# Altium footprint library PCB_CONNECTORS.PcbLib: 676 footprints (part 24 of 43) (continued)
## PHOENIX_1751248 [mm] "Terminal Block, 10A 160V, Pitch 3.5mm, 2 Positions, Screw Connection"
height 8.5
pads (2):
  round 1.8 hole 1.1: 1(-1.75,0) 2(1.75,0)
Top Overlay:
  circle w0.2: c1.75,-0.05 r1.45
  circle w0.2: c-1.75,-0.05 r1.45
  lines w0.2: -3.75,-2.049 3.75,-2.049 ; -3.75,-1.566 3.75,-1.566 ; -3.75,1.487 3.75,1.487 ; -3.75,1.962 3.75,1.962 ; -3.75,-3.6 -3.75,3.7 3.75,3.7 3.75,-3.6 -3.75,-3.6
  text "2" at 1.45,2.375 h1
  text "1" at -1.95,2.375 h1
Mechanical 8:
  lines w0.1: -2.75,0 -1.75,0 ; -1.75,-1 -1.75,0 ; -1.75,1 -1.75,0 ; -1,0 0,0 ; -0.75,0 -1.75,0 ; 0,-1 0,0 ; 0,1 0,0 ; 0.75,0 1.75,0 ; 1,0 0,0 ; 1.75,-1 1.75,0 ; 1.75,1 1.75,0 ; 2.75,0 1.75,0
Mechanical 14:
  circle w0.1: c1.75,-0.05 r1.4
  circle w0.1: c-1.75,-0.05 r1.4
  circle w0.1: c1.75,-0.05 r1.45
  circle w0.1: c-1.75,-0.05 r1.45
  lines w0.1: -3.75,-2.049 3.75,-2.049 ; -3.75,-1.566 3.75,-1.566 ; -3.75,1.487 3.75,1.487 ; -3.75,1.962 3.75,1.962 ; -2.956,-0.761 -1.039,1.156 ; -2.461,-1.256 -0.544,0.661 ; 0.544,-0.761 2.461,1.156 ; 1.039,-1.256 2.956,0.661 ; -3.75,-3.6 -3.75,3.7 3.75,3.7 3.75,-3.6 -3.75,-3.6
3D body "PHOENIX_1751248.stp": height 8.5, standoff -3.5, extent -3.75,-3.6 3.75,3.7

## PHOENIX_1751248 - duplicate [mm] "Terminal Block, 10A 160V, Pitch 3.5mm, 2 Positions, Screw Connection"
height 8.5
pads (2):
  round 1.8 hole 1.1: 1(-1.75,0) 2(1.75,0)
Top Overlay:
  circle w0.2: c1.75,-0.05 r1.45
  circle w0.2: c-1.75,-0.05 r1.45
  lines w0.2: -3.75,-2.049 3.75,-2.049 ; -3.75,-1.566 3.75,-1.566 ; -3.75,1.487 3.75,1.487 ; -3.75,1.962 3.75,1.962 ; -3.75,-3.6 -3.75,3.7 3.75,3.7 3.75,-3.6 -3.75,-3.6
  text "2" at 1.45,2.375 h1
  text "1" at -1.95,2.375 h1
Mechanical 8:
  lines w0.1: -2.75,0 -1.75,0 ; -1.75,-1 -1.75,0 ; -1.75,1 -1.75,0 ; -1,0 0,0 ; -0.75,0 -1.75,0 ; 0,-1 0,0 ; 0,1 0,0 ; 0.75,0 1.75,0 ; 1,0 0,0 ; 1.75,-1 1.75,0 ; 1.75,1 1.75,0 ; 2.75,0 1.75,0
Mechanical 14:
  circle w0.1: c1.75,-0.05 r1.4
  circle w0.1: c-1.75,-0.05 r1.4
  circle w0.1: c1.75,-0.05 r1.45
  circle w0.1: c-1.75,-0.05 r1.45
  lines w0.1: -3.75,-2.049 3.75,-2.049 ; -3.75,-1.566 3.75,-1.566 ; -3.75,1.487 3.75,1.487 ; -3.75,1.962 3.75,1.962 ; -2.956,-0.761 -1.039,1.156 ; -2.461,-1.256 -0.544,0.661 ; 0.544,-0.761 2.461,1.156 ; 1.039,-1.256 2.956,0.661 ; -3.75,-3.6 -3.75,3.7 3.75,3.7 3.75,-3.6 -3.75,-3.6
3D body "PHOENIX_1751248.stp": height 8.5, standoff -3.5, extent -3.75,-3.6 3.75,3.7

## PHOENIX_1752214 [mm] "PHOENIX STPA Serie, Pitch 5mm, 9A, 320V, 2 Positions Terminal Block (Spring-Cage Connection)"
height 12.4
pads (2):
  round 1.8 hole 1.1: 1(-2.5,0) 2(2.5,0)
Top Overlay:
  lines w0.2: -4.85,-1.072 -3.236,-1.072 ; -4.85,-0.852 -3.482,-0.852 ; -4.25,-5.7 -4.25,-1.293 -1.2,-1.293 -1.2,-5.7 ; -4.15,-1.293 -4.15,-1.724 -1.3,-1.724 -1.3,-1.303 ; -4.086,-3.716 ccw(c-2.938,-3.134) -3.514,-4.285 ; -4.06,-3.663 ccw(c-2.927,-3.102) -3.525,-4.215 ; -3.877,-3.39 ccw(c-2.909,-2.943) -3.537,-3.804 -1.913,-3.804 ; -3.7,0.5 -4.75,0.5 ; -3.536,-3.804 ccw(c-0.578,-3.907) -3.514,-4.285 ; -3.412,-3.021 ccw(c-2.725,-4.361) -4.225,-4.223 ccw(c-2.725,-4.066) -1.225,-4.214 ccw(c-2.725,-4.361) -2.037,-3.021 ; -2.87,1.246 cw(c-2.2,1.043) -1.5,1.043 -1.5,0.831 ; -1.925,-4.215 ccw(c-2.523,-3.102) -1.39,-3.662 ; -1.764,-1.072 1.764,-1.072 ; -1.573,-3.39 cw(c-2.541,-2.943) -1.913,-3.804 ; -1.518,-0.852 1.518,-0.852 ; -1.363,-3.715 cw(c-2.512,-3.134) -1.936,-4.285 ; -1.3,0.5 1.3,0.5 ; -0.75,-5.7 -0.75,-1.293 3.8,-1.293 3.8,-5.7 ; 0.75,-5.7 0.75,-1.293 ; 0.85,-1.293 0.85,-1.724 3.7,-1.724 3.7,-1.303 ; 0.914,-3.716 ccw(c2.062,-3.134) 1.486,-4.285 ; 0.94,-3.663 ccw(c2.073,-3.102) 1.475,-4.215 ; 1.123,-3.39 ccw(c2.091,-2.943) 1.463,-3.804 3.087,-3.804 ; 1.464,-3.804 ccw(c4.422,-3.907) 1.486,-4.285 ; 1.588,-3.021 ccw(c2.276,-4.361) 0.775,-4.223 ccw(c2.275,-4.066) 3.775,-4.214 ccw(c2.276,-4.361) 2.963,-3.021 ; 2.13,1.246 cw(c2.8,1.043) 3.5,1.043 3.5,0.831 ; 3.236,-1.072 4.25,-1.072 ; 3.427,-3.39 cw(c2.459,-2.943) 3.087,-3.804 ; 3.482,-0.852 4.25,-0.852 ; 3.637,-3.715 cw(c2.488,-3.134) 3.064,-4.285 ; 3.7,0.5 4.25,0.5 ; -4.75,0.5 -4.85,0.5 -4.85,-5.7 4.25,-5.7 4.25,4.3 -4.75,4.3 -4.75,0.5 ; -3.514,-4.285 ccw(c-2.725,-3.509) -1.936,-4.285 ; -1.936,-4.285 ccw(c-5.102,-3.888) -1.913,-3.804 ; 1.486,-4.285 ccw(c2.275,-3.509) 3.064,-4.285 ; 3.064,-4.285 ccw(c-0.102,-3.888) 3.087,-3.804 ; -4.15,-3.021 -1.3,-3.021 -1.3,-2.091 -4.15,-2.091 -4.15,-3.021 ; 0.85,-3.021 3.7,-3.021 3.7,-2.091 0.85,-2.091 0.85,-3.021
Mechanical 8:
  lines w0.1: -3,0 -2.5,0 ; -2.5,-0.5 -2.5,0 ; -2.5,0.5 -2.5,0 ; -2,0 -2.5,0 ; -0.5,0 0,0 ; 0,-0.5 0,0 ; 0,0.5 0,0 ; 0.5,0 0,0 ; 2,0 2.5,0 ; 2.5,-0.5 2.5,0 ; 2.5,0.5 2.5,0 ; 3,0 2.5,0
Mechanical 14:
  lines w0.1: -4.85,-1.072 4.25,-1.072 ; -4.85,-0.852 4.25,-0.852 ; -4.25,-5.7 -4.25,-1.293 -1.2,-1.293 -1.2,-5.7 ; -4.15,-1.293 -4.15,-1.724 -1.3,-1.724 -1.3,-1.303 ; -4.086,-3.716 ccw(c-2.938,-3.134) -3.514,-4.285 ; -4.06,-3.663 ccw(c-2.927,-3.102) -3.525,-4.215 ; -3.877,-3.39 ccw(c-2.909,-2.943) -3.537,-3.804 -1.913,-3.804 ; -3.536,-3.804 ccw(c-0.578,-3.907) -3.514,-4.285 ; -3.412,-3.021 ccw(c-2.725,-4.361) -4.225,-4.223 ccw(c-2.725,-4.066) -1.225,-4.214 ccw(c-2.725,-4.361) -2.037,-3.021 ; -2.9,0.64 -1.5,0.64 ; -1.925,-4.215 ccw(c-2.523,-3.102) -1.39,-3.662 ; -1.573,-3.39 cw(c-2.541,-2.943) -1.913,-3.804 ; -1.363,-3.715 cw(c-2.512,-3.134) -1.936,-4.285 ; -0.75,-5.7 -0.75,-1.293 3.8,-1.293 3.8,-5.7 ; 0.75,-5.7 0.75,-1.293 ; 0.85,-1.293 0.85,-1.724 3.7,-1.724 3.7,-1.303 ; 0.914,-3.716 ccw(c2.062,-3.134) 1.486,-4.285 ; 0.94,-3.663 ccw(c2.073,-3.102) 1.475,-4.215 ; 1.123,-3.39 ccw(c2.091,-2.943) 1.463,-3.804 3.087,-3.804 ; 1.464,-3.804 ccw(c4.422,-3.907) 1.486,-4.285 ; 1.588,-3.021 ccw(c2.276,-4.361) 0.775,-4.223 ccw(c2.275,-4.066) 3.775,-4.214 ccw(c2.276,-4.361) 2.963,-3.021 ; 2.1,0.64 3.5,0.64 ; 3.427,-3.39 cw(c2.459,-2.943) 3.087,-3.804 ; 3.637,-3.715 cw(c2.488,-3.134) 3.064,-4.285 ; 4.25,0.5 3.5,0.5 3.5,1.043 ccw(c2.8,1.043) 2.1,1.043 2.1,0.5 -1.5,0.5 -1.5,1.043 ccw(c-2.2,1.043) -2.9,1.043 -2.9,0.5 -4.75,0.5 ; -4.75,0.5 -4.75,4.3 4.25,4.3 4.25,-5.7 -4.85,-5.7 -4.85,0.5 -4.75,0.5 ; -3.514,-4.285 ccw(c-2.725,-3.509) -1.936,-4.285 ; -1.936,-4.285 ccw(c-5.102,-3.888) -1.913,-3.804 ; 1.486,-4.285 ccw(c2.275,-3.509) 3.064,-4.285 ; 3.064,-4.285 ccw(c-0.102,-3.888) 3.087,-3.804 ; -4.15,-3.021 -1.3,-3.021 -1.3,-2.091 -4.15,-2.091 -4.15,-3.021 ; 0.85,-3.021 3.7,-3.021 3.7,-2.091 0.85,-2.091 0.85,-3.021
3D body "PHOENIX_1752214.stp": height 12.4, standoff -3.5, extent -4.85,-5.7 4.25,4.3

## PHOENIX_1755736 [mm] "PCB Header, 12A 250 V, Pitch: 2.54mm, 2 Positions, MSTBVA Serie"
height 12
pads (2):
  round 2.1 hole 1.4: 1(-2.54,0) 2(2.54,0)
Top Overlay:
  lines w0.2: -6.08,4.265 -3.515,4.265 ; -5.08,-2.165 -4.58,-2.165 ; -5.08,3.128 5.08,3.128 ; -3.145,3.128 -3.145,4.738 ; -1.935,3.128 -1.935,4.738 ; 1.935,3.128 1.935,4.738 ; 3.145,3.128 3.145,4.738 ; 5.08,-2.165 4.58,-2.165 ; 6.08,4.265 3.515,4.265 ; -4.694,-2.465 ccw(c-2.54,0.036) -0.386,-2.465 ; -4.694,-2.465 -4.58,-2.165 ; -4.694,-2.465 -5.08,-2.465 -5.08,3.44 -3.515,3.44 ; -4.58,-2.165 ccw(c-2.54,0.033) -0.5,-2.165 ; -3.515,3.44 -3.184,3.128 -1.896,3.128 -1.565,3.44 ; -3.515,3.44 -3.515,4.265 ; -3.515,4.265 -3.145,4.738 ; -3.145,4.738 -1.935,4.738 ; -1.935,4.738 -1.565,4.265 ; -1.565,3.44 -1.565,4.265 ; -1.565,3.44 1.565,3.44 ; -1.565,4.265 1.565,4.265 ; -0.5,-2.165 0.5,-2.165 ; -0.5,-2.165 -0.386,-2.465 ; -0.386,-2.465 0.386,-2.465 ; 0.386,-2.465 ccw(c2.54,0.036) 4.694,-2.465 ; 0.386,-2.465 0.5,-2.165 ; 0.5,-2.165 ccw(c2.54,0.033) 4.58,-2.165 ; 1.565,3.44 1.565,4.265 ; 1.565,3.44 1.896,3.128 3.184,3.128 3.515,3.44 ; 1.565,4.265 1.935,4.738 ; 1.935,4.738 3.145,4.738 ; 3.145,4.738 3.515,4.265 ; 3.515,3.44 3.515,4.265 ; 3.515,3.44 5.08,3.44 5.08,-2.465 4.694,-2.465 ; 4.58,-2.165 4.694,-2.465 ; -6.08,-3.835 -6.08,4.765 6.08,4.765 6.08,-3.835 -6.08,-3.835
  text "1" at -2.65,1.485 h1.2
  text "2" at 2.155,1.485 h1.2
Mechanical 8:
  lines w0.1: -3.04,0 -2.54,0 ; -2.54,-0.5 -2.54,0 ; -2.54,0.5 -2.54,0 ; -2.04,0 -2.54,0 ; -0.5,0 0,0 ; 0,-0.5 0,0 ; 0,0.5 0,0 ; 0.5,0 0,0 ; 2.04,0 2.54,0 ; 2.54,-0.5 2.54,0 ; 2.54,0.5 2.54,0 ; 3.04,0 2.54,0
Mechanical 14:
  circle w0.1: c2.54,-0.035 r1.4
  lines w0.1: -6.08,4.265 -3.515,4.265 ; -5.08,-2.165 -4.58,-2.165 ; -5.08,3.128 5.08,3.128 ; -3.145,3.128 -3.145,4.738 ; -1.935,3.128 -1.935,4.738 ; 1.935,3.128 1.935,4.738 ; 3.145,3.128 3.145,4.738 ; 5.08,-2.165 4.58,-2.165 ; 6.08,4.265 3.515,4.265 ; -4.694,-2.465 ccw(c-2.54,0.036) -0.386,-2.465 ; -4.694,-2.465 -4.58,-2.165 ; -4.694,-2.465 -5.08,-2.465 -5.08,3.44 -3.515,3.44 ; -4.58,-2.165 ccw(c-2.54,0.033) -0.5,-2.165 ; -3.515,3.44 -3.184,3.128 -1.896,3.128 -1.565,3.44 ; -3.515,3.44 -3.515,4.265 ; -3.515,4.265 -3.145,4.738 ; -3.145,4.738 -1.935,4.738 ; -3.04,-0.535 -2.772,-0.267 ; -3.04,-0.535 -3.04,0.465 ; -3.04,-0.535 -2.04,-0.535 ; -3.04,0.465 -2.772,0.197 ; -3.04,0.465 -2.04,0.465 ; -2.772,-0.267 -2.772,0.197 ; -2.772,-0.267 -2.308,-0.267 ; -2.772,0.197 -2.308,0.197 ; -2.308,-0.267 -2.308,0.197 ; -2.308,-0.267 -2.04,-0.535 ; -2.308,0.197 -2.04,0.465 ; -2.04,-0.535 -2.04,0.465 ; -1.935,4.738 -1.565,4.265 ; -1.565,3.44 -1.565,4.265 ; -1.565,3.44 1.565,3.44 ; -1.565,4.265 1.565,4.265 ; -0.5,-2.165 0.5,-2.165 ; -0.5,-2.165 -0.386,-2.465 ; -0.386,-2.465 0.386,-2.465 ; 0.386,-2.465 ccw(c2.54,0.036) 4.694,-2.465 ; 0.386,-2.465 0.5,-2.165 ; 0.5,-2.165 ccw(c2.54,0.033) 4.58,-2.165 ; 1.565,3.44 1.565,4.265 ; 1.565,3.44 1.896,3.128 3.184,3.128 3.515,3.44 ; 1.565,4.265 1.935,4.738 ; 1.935,4.738 3.145,4.738 ; 2.04,-0.535 2.308,-0.267 ; 2.04,-0.535 2.04,0.465 ; 2.04,-0.535 3.04,-0.535 ; 2.04,0.465 2.308,0.197 ; 2.04,0.465 3.04,0.465 ; 2.308,-0.267 2.308,0.197 ; 2.308,-0.267 2.772,-0.267 ; 2.308,0.197 2.772,0.197 ; 2.772,-0.267 2.772,0.197 ; 2.772,-0.267 3.04,-0.535 ; 2.772,0.197 3.04,0.465 ; 3.04,-0.535 3.04,0.465 ; 3.145,4.738 3.515,4.265 ; 3.515,3.44 3.515,4.265 ; 3.515,3.44 5.08,3.44 5.08,-2.465 4.694,-2.465 ; 4.58,-2.165 4.694,-2.465 ; -6.08,-3.835 -6.08,4.765 6.08,4.765 6.08,-3.835 -6.08,-3.835 ; -3.24,-1.247 ccw(c-2.54,-0.035) -3.24,1.177 -3.24,-1.247
  text "1" at -2.65,1.485 h1.2
  text "2" at 2.155,1.485 h1.2
3D body "PHOENIX_1755736.stp": height 12, standoff -3.9, extent -6.08,-3.835 6.08,4.765

## PHOENIX_1755736 - duplicate [mm] "PCB Header, 12A 250 V, Pitch: 2.54mm, 2 Positions, MSTBVA Serie"
height 12
pads (2):
  round 2.1 hole 1.4: 1(-2.54,0) 2(2.54,0)
Top Overlay:
  lines w0.2: -6.08,4.265 -3.515,4.265 ; -5.08,-2.165 -4.58,-2.165 ; -5.08,3.128 5.08,3.128 ; -3.145,3.128 -3.145,4.738 ; -1.935,3.128 -1.935,4.738 ; 1.935,3.128 1.935,4.738 ; 3.145,3.128 3.145,4.738 ; 5.08,-2.165 4.58,-2.165 ; 6.08,4.265 3.515,4.265 ; -4.694,-2.465 ccw(c-2.54,0.036) -0.386,-2.465 ; -4.694,-2.465 -5.08,-2.465 -5.08,3.44 -3.515,3.44 ; -4.694,-2.465 -4.58,-2.165 ; -4.58,-2.165 ccw(c-2.54,0.033) -0.5,-2.165 ; -3.515,3.44 -3.515,4.265 ; -3.515,3.44 -3.184,3.128 -1.896,3.128 -1.565,3.44 ; -3.515,4.265 -3.145,4.738 ; -3.145,4.738 -1.935,4.738 ; -1.935,4.738 -1.565,4.265 ; -1.565,3.44 1.565,3.44 ; -1.565,3.44 -1.565,4.265 ; -1.565,4.265 1.565,4.265 ; -0.5,-2.165 -0.386,-2.465 ; -0.5,-2.165 0.5,-2.165 ; -0.386,-2.465 0.386,-2.465 ; 0.386,-2.465 ccw(c2.54,0.036) 4.694,-2.465 ; 0.386,-2.465 0.5,-2.165 ; 0.5,-2.165 ccw(c2.54,0.033) 4.58,-2.165 ; 1.565,3.44 1.896,3.128 3.184,3.128 3.515,3.44 ; 1.565,3.44 1.565,4.265 ; 1.565,4.265 1.935,4.738 ; 1.935,4.738 3.145,4.738 ; 3.145,4.738 3.515,4.265 ; 3.515,3.44 5.08,3.44 5.08,-2.465 4.694,-2.465 ; 3.515,3.44 3.515,4.265 ; 4.58,-2.165 4.694,-2.465 ; -6.08,-3.835 6.08,-3.835 6.08,4.765 -6.08,4.765 -6.08,-3.835
  text "2" at 2.2,3.5 h1
  text "1" at -2.7,3.425 h1
Mechanical 8:
  lines w0.1: -3.04,0 -2.54,0 ; -2.54,-0.5 -2.54,0 ; -2.54,0.5 -2.54,0 ; -2.04,0 -2.54,0 ; -0.5,0 0,0 ; 0,-0.5 0,0 ; 0,0.5 0,0 ; 0.5,0 0,0 ; 2.04,0 2.54,0 ; 2.54,-0.5 2.54,0 ; 2.54,0.5 2.54,0 ; 3.04,0 2.54,0
Mechanical 14:
  circle w0.1: c2.54,-0.035 r1.4
  lines w0.1: -6.08,4.265 -3.515,4.265 ; -5.08,-2.165 -4.58,-2.165 ; -5.08,3.128 5.08,3.128 ; -3.145,3.128 -3.145,4.738 ; -1.935,3.128 -1.935,4.738 ; 1.935,3.128 1.935,4.738 ; 3.145,3.128 3.145,4.738 ; 5.08,-2.165 4.58,-2.165 ; 6.08,4.265 3.515,4.265 ; -4.694,-2.465 ccw(c-2.54,0.036) -0.386,-2.465 ; -4.694,-2.465 -5.08,-2.465 -5.08,3.44 -3.515,3.44 ; -4.694,-2.465 -4.58,-2.165 ; -4.58,-2.165 ccw(c-2.54,0.033) -0.5,-2.165 ; -3.515,3.44 -3.515,4.265 ; -3.515,3.44 -3.184,3.128 -1.896,3.128 -1.565,3.44 ; -3.515,4.265 -3.145,4.738 ; -3.145,4.738 -1.935,4.738 ; -3.04,-0.535 -2.04,-0.535 ; -3.04,-0.535 -3.04,0.465 ; -3.04,-0.535 -2.772,-0.267 ; -3.04,0.465 -2.04,0.465 ; -3.04,0.465 -2.772,0.197 ; -2.772,-0.267 -2.308,-0.267 ; -2.772,-0.267 -2.772,0.197 ; -2.772,0.197 -2.308,0.197 ; -2.308,-0.267 -2.04,-0.535 ; -2.308,-0.267 -2.308,0.197 ; -2.308,0.197 -2.04,0.465 ; -2.04,-0.535 -2.04,0.465 ; -1.935,4.738 -1.565,4.265 ; -1.565,3.44 1.565,3.44 ; -1.565,3.44 -1.565,4.265 ; -1.565,4.265 1.565,4.265 ; -0.5,-2.165 -0.386,-2.465 ; -0.5,-2.165 0.5,-2.165 ; -0.386,-2.465 0.386,-2.465 ; 0.386,-2.465 ccw(c2.54,0.036) 4.694,-2.465 ; 0.386,-2.465 0.5,-2.165 ; 0.5,-2.165 ccw(c2.54,0.033) 4.58,-2.165 ; 1.565,3.44 1.896,3.128 3.184,3.128 3.515,3.44 ; 1.565,3.44 1.565,4.265 ; 1.565,4.265 1.935,4.738 ; 1.935,4.738 3.145,4.738 ; 2.04,-0.535 3.04,-0.535 ; 2.04,-0.535 2.04,0.465 ; 2.04,-0.535 2.308,-0.267 ; 2.04,0.465 3.04,0.465 ; 2.04,0.465 2.308,0.197 ; 2.308,-0.267 2.772,-0.267 ; 2.308,-0.267 2.308,0.197 ; 2.308,0.197 2.772,0.197 ; 2.772,-0.267 3.04,-0.535 ; 2.772,-0.267 2.772,0.197 ; 2.772,0.197 3.04,0.465 ; 3.04,-0.535 3.04,0.465 ; 3.145,4.738 3.515,4.265 ; 3.515,3.44 5.08,3.44 5.08,-2.465 4.694,-2.465 ; 3.515,3.44 3.515,4.265 ; 4.58,-2.165 4.694,-2.465 ; -6.08,-3.835 6.08,-3.835 6.08,4.765 -6.08,4.765 -6.08,-3.835 ; -3.24,-1.247 ccw(c-2.54,-0.035) -3.24,1.177 -3.24,-1.247
  text "1" at -2.7,3.425 h1
  text "2" at 2.2,3.5 h1
3D body "PHOENIX_1755736.stp": height 12, standoff -3.9, extent -6.08,-3.835 6.08,4.765

## PHOENIX_1755749 [mm] "PCB Header, 12A 250 V, Pitch: 2.54mm, 3 Positions, MSTBVA Serie"
height 12
pads (3):
  round 2.1 hole 1.4: 1(-5.08,0) 2(0,0) 3(5.08,0)
Top Overlay:
  lines w0.2: -8.62,4.3 -6.055,4.3 ; -7.62,-2.13 -7.12,-2.13 ; -7.234,-2.43 ccw(c-5.08,0.071) -2.926,-2.43 -3.04,-2.13 ; -5.685,3.163 -5.685,4.773 ; -4.475,3.163 -4.475,4.773 ; -2.926,-2.43 -2.154,-2.43 -2.04,-2.13 ; -2.154,-2.43 ccw(c0,0.071) 2.154,-2.43 2.04,-2.13 ; -0.605,3.163 -0.605,4.773 ; 0.605,3.163 0.605,4.773 ; 2.154,-2.43 2.926,-2.43 3.04,-2.13 ; 2.926,-2.43 ccw(c5.08,0.071) 7.234,-2.43 ; 4.475,3.163 4.475,4.773 ; 5.685,3.163 5.685,4.773 ; 7.62,-2.13 7.12,-2.13 ; 8.62,4.3 6.055,4.3 ; -7.234,-2.43 -7.62,-2.43 -7.62,3.475 -6.055,3.475 ; -7.234,-2.43 -7.12,-2.13 ; -7.234,-2.43 -7.12,-2.13 ; -7.12,-2.13 ccw(c-5.08,0.068) -3.04,-2.13 ; -6.055,3.475 -5.724,3.163 -4.436,3.163 -4.105,3.475 ; -6.055,3.475 -6.055,4.3 ; -6.055,4.3 -5.685,4.773 ; -5.685,4.773 -4.475,4.773 ; -4.475,4.773 -4.105,4.3 ; -4.105,3.475 -4.105,4.3 ; -4.105,3.475 -0.975,3.475 ; -4.105,4.3 -0.975,4.3 ; -3.04,-2.13 -2.04,-2.13 ; -2.04,-2.13 ccw(c0,0.068) 2.04,-2.13 ; -0.975,3.475 -0.644,3.163 0.644,3.163 0.975,3.475 ; -0.975,3.475 -0.975,4.3 ; -0.975,4.3 -0.605,4.773 ; -0.605,4.773 0.605,4.773 ; 0.605,4.773 0.975,4.3 ; 0.975,3.475 0.975,4.3 ; 0.975,3.475 4.105,3.475 ; 0.975,4.3 4.105,4.3 ; 2.04,-2.13 3.04,-2.13 ; 3.04,-2.13 ccw(c5.08,0.068) 7.12,-2.13 ; 4.105,3.475 4.436,3.163 5.724,3.163 6.055,3.475 ; 4.105,3.475 4.105,4.3 ; 4.105,4.3 4.475,4.773 ; 4.475,4.773 5.685,4.773 ; 5.685,4.773 6.055,4.3 ; 6.055,3.475 6.055,4.3 ; 6.055,3.475 7.62,3.475 7.62,-2.43 7.234,-2.43 ; 7.12,-2.13 7.234,-2.43 ; 7.12,-2.13 7.234,-2.43 ; -8.62,-3.8 8.62,-3.8 8.62,4.8 -8.62,4.8 -8.62,-3.8
  text "1" at -5.19,1.485 h1.2
  text "3" at 4.695,1.485 h1.2
Mechanical 8:
  lines w0.1: -5.58,0 -5.08,0 ; -5.08,-0.5 -5.08,0 ; -5.08,0.5 -5.08,0 ; -4.58,0 -5.08,0 ; 4.58,0 5.08,0 ; 5.08,-0.5 5.08,0 ; 5.08,0.5 5.08,0 ; 5.58,0 5.08,0 ; 0,0 0,0.5 0,0 ; 0,0 0.5,0 0,0 ; 0,0 0,-0.5 0,0 ; 0,0 -0.5,0 0,0
Mechanical 14:
  circle w0.1: c-5.08,0 r1.4
  circle w0.1: c0,0 r1.4
  circle w0.1: c5.08,0 r1.4
  lines w0.1: -8.62,4.3 -6.055,4.3 ; -7.62,-2.13 -7.12,-2.13 ; -7.234,-2.43 ccw(c-5.08,0.071) -2.926,-2.43 -3.04,-2.13 ; -5.685,3.163 -5.685,4.773 ; -4.475,3.163 -4.475,4.773 ; -2.926,-2.43 -2.154,-2.43 -2.04,-2.13 ; -2.154,-2.43 ccw(c0,0.071) 2.154,-2.43 2.04,-2.13 ; -0.605,3.163 -0.605,4.773 ; 0.605,3.163 0.605,4.773 ; 2.154,-2.43 2.926,-2.43 3.04,-2.13 ; 2.926,-2.43 ccw(c5.08,0.071) 7.234,-2.43 ; 4.475,3.163 4.475,4.773 ; 5.685,3.163 5.685,4.773 ; 7.62,-2.13 7.12,-2.13 ; 8.62,4.3 6.055,4.3 ; -7.234,-2.43 -7.62,-2.43 -7.62,3.475 -6.055,3.475 ; -7.234,-2.43 -7.12,-2.13 ; -7.234,-2.43 -7.12,-2.13 ; -7.12,-2.13 ccw(c-5.08,0.068) -3.04,-2.13 ; -6.055,3.475 -5.724,3.163 -4.436,3.163 -4.105,3.475 ; -6.055,3.475 -6.055,4.3 ; -6.055,4.3 -5.685,4.773 ; -5.685,4.773 -4.475,4.773 ; -5.58,-0.5 -4.58,-0.5 ; -5.58,-0.5 -5.58,0.5 ; -5.58,-0.5 -5.312,-0.232 ; -5.58,0.5 -4.58,0.5 ; -5.58,0.5 -5.312,0.232 ; -5.312,-0.232 -4.848,-0.232 ; -5.312,-0.232 -5.312,0.232 ; -5.312,0.232 -4.848,0.232 ; -4.848,-0.232 -4.58,-0.5 ; -4.848,-0.232 -4.848,0.232 ; -4.848,0.232 -4.58,0.5 ; -4.58,-0.5 -4.58,0.5 ; -4.475,4.773 -4.105,4.3 ; -4.105,3.475 -4.105,4.3 ; -4.105,3.475 -0.975,3.475 ; -4.105,4.3 -0.975,4.3 ; -3.04,-2.13 -2.04,-2.13 ; -2.04,-2.13 ccw(c0,0.068) 2.04,-2.13 ; -0.975,3.475 -0.644,3.163 0.644,3.163 0.975,3.475 ; -0.975,3.475 -0.975,4.3 ; -0.975,4.3 -0.605,4.773 ; -0.605,4.773 0.605,4.773 ; -0.5,-0.5 0.5,-0.5 ; -0.5,-0.5 -0.5,0.5 ; -0.5,-0.5 -0.232,-0.232 ; -0.5,0.5 0.5,0.5 ; -0.5,0.5 -0.232,0.232 ; -0.232,-0.232 0.232,-0.232 ; -0.232,-0.232 -0.232,0.232 ; -0.232,0.232 0.232,0.232 ; 0.232,-0.232 0.5,-0.5 ; 0.232,-0.232 0.232,0.232 ; 0.232,0.232 0.5,0.5 ; 0.5,-0.5 0.5,0.5 ; 0.605,4.773 0.975,4.3 ; 0.975,3.475 0.975,4.3 ; 0.975,3.475 4.105,3.475 ; 0.975,4.3 4.105,4.3 ; 2.04,-2.13 3.04,-2.13 ; 3.04,-2.13 ccw(c5.08,0.068) 7.12,-2.13 ; 4.105,3.475 4.436,3.163 5.724,3.163 6.055,3.475 ; 4.105,3.475 4.105,4.3 ; 4.105,4.3 4.475,4.773 ; 4.475,4.773 5.685,4.773 ; 4.58,-0.5 5.58,-0.5 ; 4.58,-0.5 4.58,0.5 ; 4.58,-0.5 4.848,-0.232 ; 4.58,0.5 5.58,0.5 ; 4.58,0.5 4.848,0.232 ; 4.848,-0.232 5.312,-0.232 ; 4.848,-0.232 4.848,0.232 ; 4.848,0.232 5.312,0.232 ; 5.312,-0.232 5.58,-0.5 ; 5.312,-0.232 5.312,0.232 ; 5.312,0.232 5.58,0.5 ; 5.58,-0.5 5.58,0.5 ; 5.685,4.773 6.055,4.3 ; 6.055,3.475 6.055,4.3 ; 6.055,3.475 7.62,3.475 7.62,-2.43 7.234,-2.43 ; 7.12,-2.13 7.234,-2.43 ; 7.12,-2.13 7.234,-2.43 ; -8.62,-3.8 8.62,-3.8 8.62,4.8 -8.62,4.8 -8.62,-3.8
  text "1" at -5.19,1.485 h1.2
  text "3" at 4.695,1.485 h1.2
3D body "PHOENIX_1755749.stp": height 12, standoff -3.9, extent -8.62,-3.8 8.62,4.8

## PHOENIX_1755752 [mm] "PCB Header, 12A 250 V, Pitch: 2.54mm, 4 Positions, MSTBVA Serie"
height 12
pads (4):
  round 2.1 hole 1.4: 1(-7.62,0) 2(-2.54,0) 3(2.54,0) 4(7.62,0)
Top Overlay:
  lines w0.2: -11.16,4.265 -8.595,4.265 ; -10.16,-2.165 -9.66,-2.165 ; -8.225,3.128 -8.225,4.738 ; -7.015,3.128 -7.015,4.738 ; -3.145,3.128 -3.145,4.738 ; -1.935,3.128 -1.935,4.738 ; 1.935,3.128 1.935,4.738 ; 3.145,3.128 3.145,4.738 ; 7.015,3.128 7.015,4.738 ; 8.225,3.128 8.225,4.738 ; 10.16,-2.165 9.66,-2.165 ; 10.16,3.44 10.16,-2.465 9.774,-2.465 ; 11.16,3.44 8.595,3.44 ; 11.16,4.265 8.595,4.265 ; -9.774,-2.465 ccw(c-7.62,0.036) -5.466,-2.465 ; -9.774,-2.465 -10.16,-2.465 -10.16,3.44 -8.595,3.44 ; -9.774,-2.465 -9.66,-2.165 ; -9.66,-2.165 ccw(c-7.62,0.033) -5.58,-2.165 ; -8.595,3.44 -8.595,4.265 ; -8.595,3.44 -8.264,3.128 -6.976,3.128 -6.645,3.44 ; -8.595,4.265 -8.225,4.738 ; -8.225,4.738 -7.015,4.738 ; -7.015,4.738 -6.645,4.265 ; -6.645,3.44 -3.515,3.44 ; -6.645,3.44 -6.645,4.265 ; -6.645,4.265 -3.515,4.265 ; -5.58,-2.165 -5.466,-2.465 ; -5.58,-2.165 -4.58,-2.165 ; -5.466,-2.465 -4.694,-2.465 ; -4.694,-2.465 ccw(c-2.54,0.036) -0.386,-2.465 ; -4.694,-2.465 -4.58,-2.165 ; -4.58,-2.165 ccw(c-2.54,0.033) -0.5,-2.165 ; -3.515,3.44 -3.184,3.128 -1.896,3.128 -1.565,3.44 ; -3.515,3.44 -3.515,4.265 ; -3.515,4.265 -3.145,4.738 ; -3.145,4.738 -1.935,4.738 ; -1.935,4.738 -1.565,4.265 ; -1.565,3.44 -1.565,4.265 ; -1.565,3.44 1.565,3.44 ; -1.565,4.265 1.565,4.265 ; -0.5,-2.165 -0.386,-2.465 ; -0.5,-2.165 0.5,-2.165 ; -0.386,-2.465 0.386,-2.465 ; 0.386,-2.465 ccw(c2.54,0.036) 4.694,-2.465 ; 0.386,-2.465 0.5,-2.165 ; 0.5,-2.165 ccw(c2.54,0.033) 4.58,-2.165 ; 1.565,3.44 1.896,3.128 3.184,3.128 3.515,3.44 ; 1.565,3.44 1.565,4.265 ; 1.565,4.265 1.935,4.738 ; 1.935,4.738 3.145,4.738 ; 3.145,4.738 3.515,4.265 ; 3.515,3.44 3.515,4.265 ; 3.515,3.44 6.645,3.44 ; 3.515,4.265 6.645,4.265 ; 4.58,-2.165 4.694,-2.465 ; 4.58,-2.165 5.58,-2.165 ; 4.694,-2.465 5.466,-2.465 ; 5.466,-2.465 ccw(c7.62,0.036) 9.774,-2.465 ; 5.466,-2.465 5.58,-2.165 ; 5.58,-2.165 ccw(c7.62,0.033) 9.66,-2.165 ; 6.645,3.44 6.976,3.128 8.264,3.128 8.595,3.44 ; 6.645,3.44 6.645,4.265 ; 6.645,4.265 7.015,4.738 ; 7.015,4.738 8.225,4.738 ; 8.225,4.738 8.595,4.265 ; 8.595,3.44 8.595,4.265 ; 9.66,-2.165 9.774,-2.465 ; -11.16,-3.835 11.16,-3.835 11.16,4.765 -11.16,4.765 -11.16,-3.835
  text "1" at -7.78,3.425 h1
  text "2" at -2.875,3.425 h1
  text "3" at 2.205,3.425 h1
  text "4" at 7.285,3.425 h1
Mechanical 8:
  lines w0.1: -3.04,0 -2.54,0 ; -2.54,-0.5 -2.54,0 ; -2.54,0.5 -2.54,0 ; -2.04,0 -2.54,0 ; -0.5,0 0,0 ; 0,-0.5 0,0 ; 0,0.5 0,0 ; 0.5,0 0,0 ; 2.04,0 2.54,0 ; 2.54,-0.5 2.54,0 ; 2.54,0.5 2.54,0 ; 3.04,0 2.54,0 ; 7.12,0 7.62,0 ; 7.62,-0.5 7.62,0 ; 7.62,0.5 7.62,0 ; 8.12,0 7.62,0 ; -7.62,0 -8.12,0 -7.62,0 ; -7.62,0 -7.62,0.5 -7.62,0 ; -7.62,0 -7.12,0 -7.62,0 ; -7.62,0 -7.62,-0.5 -7.62,0
Mechanical 14:
  circle w0.1: c-2.54,-0.035 r1.4
  circle w0.1: c2.54,-0.035 r1.4
  circle w0.1: c7.62,-0.035 r1.4
  lines w0.1: -11.16,4.265 -8.595,4.265 ; -10.16,-2.165 -9.66,-2.165 ; -8.225,3.128 -8.225,4.738 ; -7.015,3.128 -7.015,4.738 ; -3.145,3.128 -3.145,4.738 ; -1.935,3.128 -1.935,4.738 ; 1.935,3.128 1.935,4.738 ; 3.145,3.128 3.145,4.738 ; 7.015,3.128 7.015,4.738 ; 8.225,3.128 8.225,4.738 ; 10.16,-2.165 9.66,-2.165 ; 10.16,3.44 10.16,-2.465 9.774,-2.465 ; 11.16,3.44 8.595,3.44 ; 11.16,4.265 8.595,4.265 ; -9.774,-2.465 ccw(c-7.62,0.036) -5.466,-2.465 ; -9.774,-2.465 -10.16,-2.465 -10.16,3.44 -8.595,3.44 ; -9.774,-2.465 -9.66,-2.165 ; -9.66,-2.165 ccw(c-7.62,0.033) -5.58,-2.165 ; -8.595,3.44 -8.595,4.265 ; -8.595,3.44 -8.264,3.128 -6.976,3.128 -6.645,3.44 ; -8.595,4.265 -8.225,4.738 ; -8.225,4.738 -7.015,4.738 ; -8.12,-0.535 -7.12,-0.535 ; -8.12,-0.535 -8.12,0.465 ; -8.12,-0.535 -7.852,-0.267 ; -8.12,0.465 -7.12,0.465 ; -8.12,0.465 -7.852,0.197 ; -7.852,-0.267 -7.388,-0.267 ; -7.852,-0.267 -7.852,0.197 ; -7.852,0.197 -7.388,0.197 ; -7.388,-0.267 -7.12,-0.535 ; -7.388,-0.267 -7.388,0.197 ; -7.388,0.197 -7.12,0.465 ; -7.12,-0.535 -7.12,0.465 ; -7.015,4.738 -6.645,4.265 ; -6.645,3.44 -3.515,3.44 ; -6.645,3.44 -6.645,4.265 ; -6.645,4.265 -3.515,4.265 ; -5.58,-2.165 -5.466,-2.465 ; -5.58,-2.165 -4.58,-2.165 ; -5.466,-2.465 -4.694,-2.465 ; -4.694,-2.465 ccw(c-2.54,0.036) -0.386,-2.465 ; -4.694,-2.465 -4.58,-2.165 ; -4.58,-2.165 ccw(c-2.54,0.033) -0.5,-2.165 ; -3.515,3.44 -3.184,3.128 -1.896,3.128 -1.565,3.44 ; -3.515,3.44 -3.515,4.265 ; -3.515,4.265 -3.145,4.738 ; -3.145,4.738 -1.935,4.738 ; -3.04,-0.535 -2.04,-0.535 ; -3.04,-0.535 -3.04,0.465 ; -3.04,-0.535 -2.772,-0.267 ; -3.04,0.465 -2.04,0.465 ; -3.04,0.465 -2.772,0.197 ; -2.772,-0.267 -2.308,-0.267 ; -2.772,-0.267 -2.772,0.197 ; -2.772,0.197 -2.308,0.197 ; -2.308,-0.267 -2.04,-0.535 ; -2.308,-0.267 -2.308,0.197 ; -2.308,0.197 -2.04,0.465 ; -2.04,-0.535 -2.04,0.465 ; -1.935,4.738 -1.565,4.265 ; -1.565,3.44 -1.565,4.265 ; -1.565,3.44 1.565,3.44 ; -1.565,4.265 1.565,4.265 ; -0.5,-2.165 -0.386,-2.465 ; -0.5,-2.165 0.5,-2.165 ; -0.386,-2.465 0.386,-2.465 ; 0.386,-2.465 ccw(c2.54,0.036) 4.694,-2.465 ; 0.386,-2.465 0.5,-2.165 ; 0.5,-2.165 ccw(c2.54,0.033) 4.58,-2.165 ; 1.565,3.44 1.896,3.128 3.184,3.128 3.515,3.44 ; 1.565,3.44 1.565,4.265 ; 1.565,4.265 1.935,4.738 ; 1.935,4.738 3.145,4.738 ; 2.04,-0.535 3.04,-0.535 ; 2.04,-0.535 2.04,0.465 ; 2.04,-0.535 2.308,-0.267 ; 2.04,0.465 3.04,0.465 ; 2.04,0.465 2.308,0.197 ; 2.308,-0.267 2.772,-0.267 ; 2.308,-0.267 2.308,0.197 ; 2.308,0.197 2.772,0.197 ; 2.772,-0.267 3.04,-0.535 ; 2.772,-0.267 2.772,0.197 ; 2.772,0.197 3.04,0.465 ; 3.04,-0.535 3.04,0.465 ; 3.145,4.738 3.515,4.265 ; 3.515,3.44 3.515,4.265 ; 3.515,3.44 6.645,3.44 ; 3.515,4.265 6.645,4.265 ; 4.58,-2.165 4.694,-2.465 ; 4.58,-2.165 5.58,-2.165 ; 4.694,-2.465 5.466,-2.465 ; 5.466,-2.465 ccw(c7.62,0.036) 9.774,-2.465 ; 5.466,-2.465 5.58,-2.165 ; 5.58,-2.165 ccw(c7.62,0.033) 9.66,-2.165 ; 6.645,3.44 6.976,3.128 8.264,3.128 8.595,3.44 ; 6.645,3.44 6.645,4.265 ; 6.645,4.265 7.015,4.738 ; 7.015,4.738 8.225,4.738 ; 7.12,-0.535 8.12,-0.535 ; 7.12,-0.535 7.12,0.465 ; 7.12,-0.535 7.388,-0.267 ; 7.12,0.465 8.12,0.465 ; 7.12,0.465 7.388,0.197 ; 7.388,-0.267 7.852,-0.267 ; 7.388,-0.267 7.388,0.197 ; 7.388,0.197 7.852,0.197 ; 7.852,-0.267 8.12,-0.535 ; 7.852,-0.267 7.852,0.197 ; 7.852,0.197 8.12,0.465 ; 8.12,-0.535 8.12,0.465 ; 8.225,4.738 8.595,4.265 ; 8.595,3.44 8.595,4.265 ; 9.66,-2.165 9.774,-2.465 ; -11.16,-3.835 11.16,-3.835 11.16,4.765 -11.16,4.765 -11.16,-3.835 ; -8.32,-1.247 ccw(c-7.62,-0.035) -8.32,1.177 -8.32,-1.247
  text "1" at -7.78,3.425 h1
  text "2" at -2.875,3.425 h1
  text "3" at 2.205,3.425 h1
  text "4" at 7.285,3.425 h1
3D body "PHOENIX_1755752.stp": height 12, standoff -3.9, extent -11.16,-3.835 11.16,4.765